# Altium footprint library MyComponents_v2.5.PcbLib: 403 footprints (part 16 of 26)
Each footprint in its own frame and in the unit in brackets; x right, y up, seen from the top. Pads: shape width x height; smd on the part's side, far side on the other; paste and mask are expansions set on the pad; w line width, h text height; cw(c..) or ccw(c..) is an arc to the next point about the centre after c.
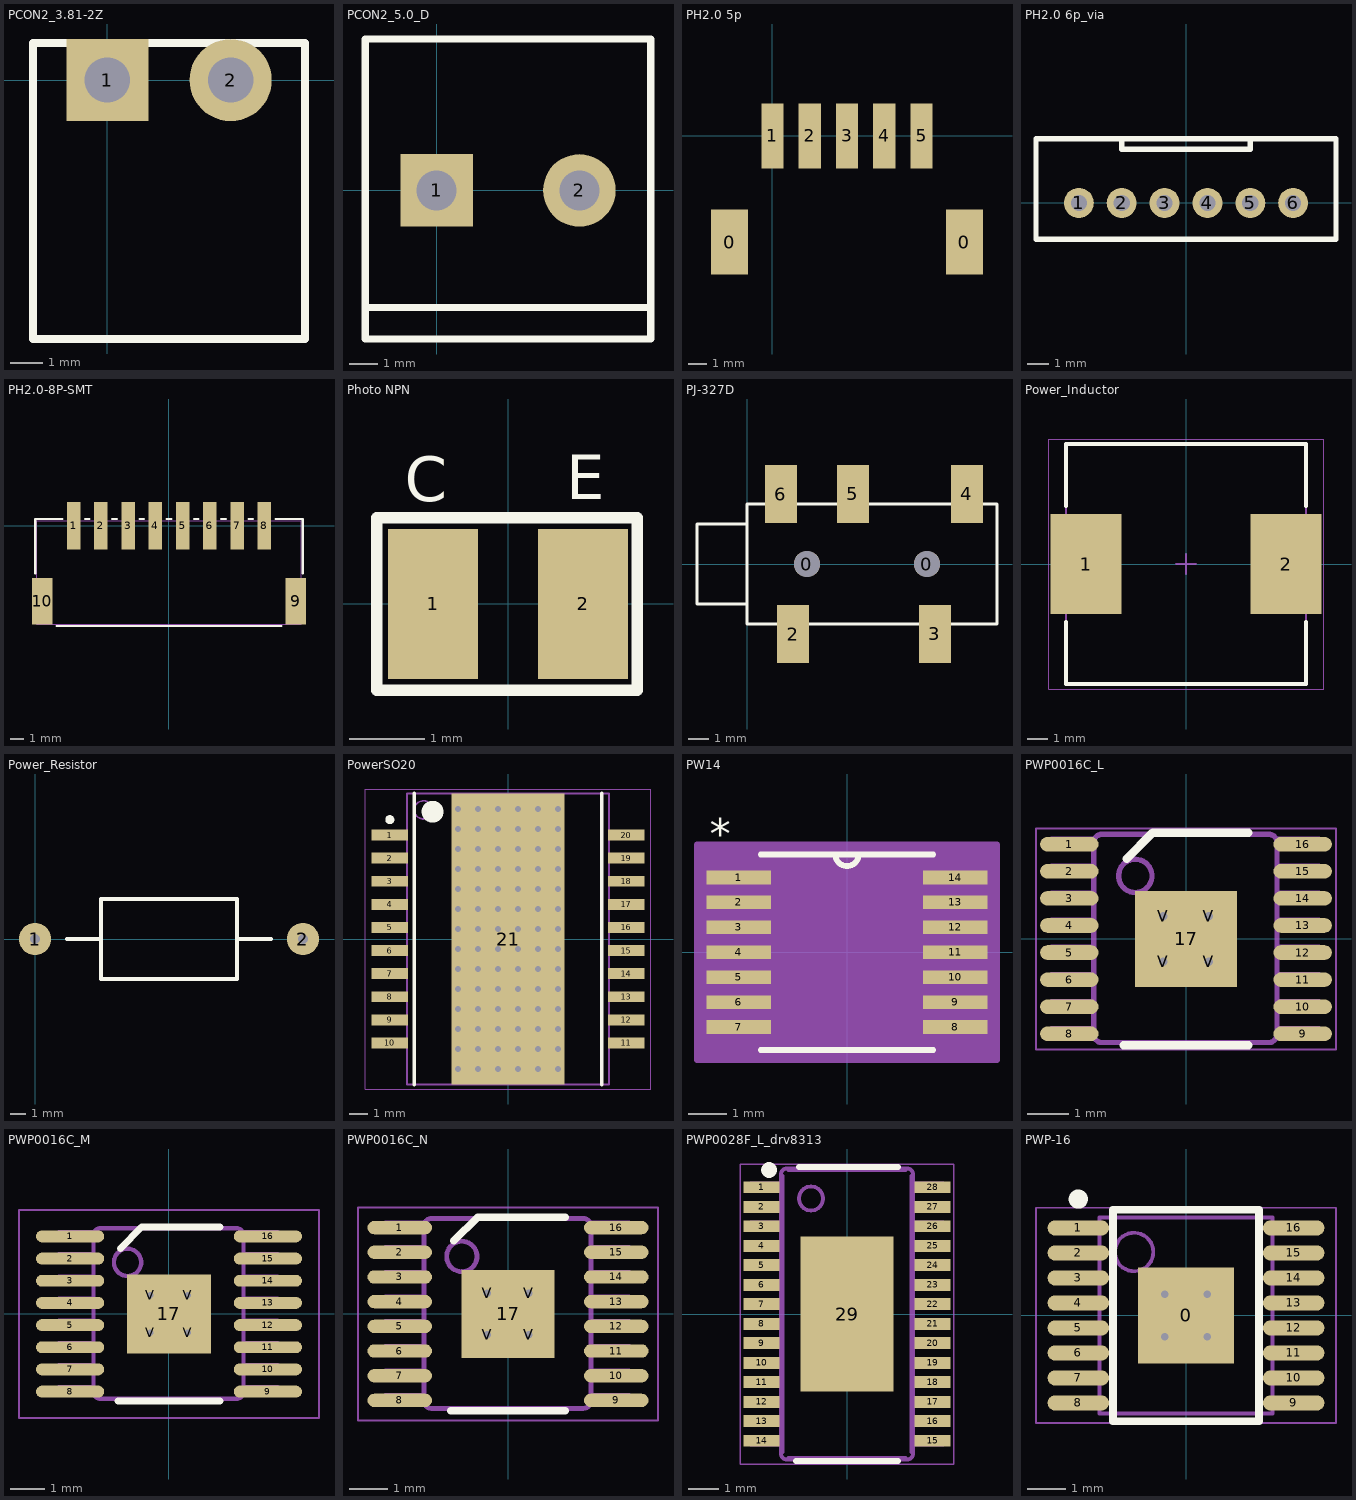
[diagram p15: the footprints below, top view; thin cyan lines are the x and y axes]

## PCON2_3.81-2Z [mm]
pads (2):
  rect 2.54x2.54 hole 1.4: 1(0,0)
  round 2.54 hole 1.4: 2(3.81,0)
Top Overlay:
  lines w0.254: -2.3,-8.001 -2.3,1.143 6.11,1.143 6.11,-8 -2.286,-8

## PCON2_5.0_D [mm]
pads (2):
  rect 2.54x2.54 hole 1.4: 1(0,0)
  round 2.54 hole 1.4: 2(5,0)
Top Overlay:
  lines w0.254: -2.4,-4.1 7.5,-4.1 ; -2.5,-5.2 -2.5,5.3 7.5,5.3 7.5,-5.2 -2.5,-5.2

## PH2.0 5p [mm]
pads (7):
  rect 2x3.5 smd: 0(-2.3,-5.7) 0(10.3,-5.7)
  rect 1.2x3.5 smd: 1(0,0) 2(2,0) 3(4,0) 4(6,0) 5(8,0)

## PH2.0 6p_via [mm]
pads (6):
  round 1.4 hole 0.75: 1(-5,0) 2(-3,0) 3(-1,0) 4(1,0) 5(3,0) 6(5,0)
Top Overlay:
  lines w0.254: -3,3 -3,2.5 3,2.5 3,3 ; -7,-1.7 7,-1.7 7,3 -7,3 -7,-1.7

## PH2.0-8P-SMT [mm]
pads (10):
  rect 1x3.5 smd paste+0 mask+0: 1(-7,0) 2(-5,0) 3(-3,0) 4(-1,0) 5(1,0) 6(3,0) 7(5,0) 8(7,0)
  rect 1.5x3.4 smd: 9(9.32,-5.55) 10(-9.32,-5.55)
Top Overlay:
  lines w0.152: -9.827,-3.517 -9.827,0.477 -7.833,0.477 ; -8.262,-7.377 8.262,-7.377 ; -6.167,0.477 -5.833,0.477 ; -4.167,0.477 -3.833,0.477 ; -2.167,0.477 -1.833,0.477 ; -0.167,0.477 0.167,0.477 ; 1.833,0.477 2.167,0.477 ; 3.833,0.477 4.167,0.477 ; 5.833,0.477 6.167,0.477 ; 7.833,0.477 9.827,0.477 9.827,-3.517
Mechanical 13:
  lines w0.025: -9.7,-7.25 -9.7,0.35 9.7,0.35 9.7,-7.25 -9.7,-7.25
3D body "PH2.0_SMT_8P.stp": height 5.6, standoff 0, extent -9.7,-7 9.7,1.6
3D body: height 0.25, standoff 0, extent -7.254,-0.254 -7,0

## Photo NPN [mm] "Photo NPN for 测评测速模块"
pads (2):
  rect 1.2x2 smd: 1(-1,0) 2(1,0)
Top Overlay:
  lines w0.15: -1.75,-1.15 1.725,-1.15 1.725,1.15 -1.75,1.15 -1.75,-1.15
  text "E" at 0.775,1.2 h1.02
  text "C" at -1.375,1.175 h1.02

## PJ-327D [mm]
pads (7):
  round 1.3 hole 1.3: 0(3,0) 0(9,0)
  rect 1.6x2.9 smd: 2(2.3,-3.5) 3(9.39,-3.5) 4(10.99,3.5) 5(5.3,3.5) 6(1.7,3.5)
Top Overlay:
  lines w0.127: 0,-2 -2.5,-2 -2.5,2 0,2 ; 0,-3 12.5,-3 12.5,3 0,3 0,0 0,-3

## Power_Inductor [mm] "Precision Wire Wound Inductor, 2-Leads, Body 12.00x12.00mm, IPC Medium Density"
height 7
pads (2):
  rect 3.55x5 smd: 1(-5,0) 2(5,0)
Top Overlay:
  lines w0.2: -6,-2.9 -6,-6 6,-6 6,-2.9 ; -6,2.9 -6,6 6,6 6,2.9
Mechanical 13:
  lines w0.1: -6,-6 -6,6 6,6 6,-6 -6,-6
Mechanical 15:
  lines w0.05: -6.875,-6.25 -6.875,6.25 6.875,6.25 6.875,-6.25 -6.875,-6.25
  lines w0.1: -0.5,0 0.5,0 ; 0,-0.5 0,0.5
3D body "Inductor12x12x6.step": height 6.21, standoff -0.09, extent -6.1,-6.1 6.1,6.1

## Power_Resistor [mil]
pads (2):
  round 80 hole 25: 1(0,0) 2(669.29,0)
Top Overlay:
  lines w10: 80,0 165,0 ; 504.29,0 589.29,0 ; 165,0 165,100 504.29,100 504.29,-100 165,-100 165,0

## PowerSO20 [mm] "SOIC, 20-Leads, Body 15.90x11.00mm, Pitch 1.27mm, Thermal Pad 16.00x6.20mm, IPC Medium Density"
height 3.6
pads (21):
  rect 2x0.6 smd: 1(-6.5,5.715) 2(-6.5,4.445) 3(-6.5,3.175) 4(-6.5,1.905) 5(-6.5,0.635) 6(-6.5,-0.635) 7(-6.5,-1.905) 8(-6.5,-3.175) 9(-6.5,-4.445) 10(-6.5,-5.715) 11(6.5,-5.715) 12(6.5,-4.445) 13(6.5,-3.175) 14(6.5,-1.905) 15(6.5,-0.635) 16(6.5,0.635) 17(6.5,1.905) 18(6.5,3.175) 19(6.5,4.445) 20(6.5,5.715)
  rect 6.2x16 smd: 21(0,0)
via 2.75,6.05 diameter 0.635 hole 0.305
via -2.75,6.05 diameter 0.635 hole 0.305
via -1.65,6.05 diameter 0.635 hole 0.305
via -0.55,6.05 diameter 0.635 hole 0.305
via 0.55,6.05 diameter 0.635 hole 0.305
via 1.65,6.05 diameter 0.635 hole 0.305
via 2.75,3.85 diameter 0.635 hole 0.305
via -2.75,3.85 diameter 0.635 hole 0.305
via -1.65,3.85 diameter 0.635 hole 0.305
via -0.55,3.85 diameter 0.635 hole 0.305
via 0.55,3.85 diameter 0.635 hole 0.305
via 1.65,3.85 diameter 0.635 hole 0.305
via 2.75,7.15 diameter 0.635 hole 0.305
via 2.75,4.95 diameter 0.635 hole 0.305
via 2.75,2.75 diameter 0.635 hole 0.305
via 2.75,1.65 diameter 0.635 hole 0.305
via 2.75,0.55 diameter 0.635 hole 0.305
via 2.75,-0.55 diameter 0.635 hole 0.305
via 2.75,-1.65 diameter 0.635 hole 0.305
via 2.75,-2.75 diameter 0.635 hole 0.305
via 2.75,-3.85 diameter 0.635 hole 0.305
via 2.75,-4.95 diameter 0.635 hole 0.305
via 2.75,-6.05 diameter 0.635 hole 0.305
via 2.75,-7.15 diameter 0.635 hole 0.305
via -2.75,7.15 diameter 0.635 hole 0.305
via -1.65,7.15 diameter 0.635 hole 0.305
via -0.55,7.15 diameter 0.635 hole 0.305
via 0.55,7.15 diameter 0.635 hole 0.305
via 1.65,7.15 diameter 0.635 hole 0.305
via -2.75,4.95 diameter 0.635 hole 0.305
via -1.65,4.95 diameter 0.635 hole 0.305
via -0.55,4.95 diameter 0.635 hole 0.305
via 0.55,4.95 diameter 0.635 hole 0.305
via 1.65,4.95 diameter 0.635 hole 0.305
via -2.75,2.75 diameter 0.635 hole 0.305
via -1.65,2.75 diameter 0.635 hole 0.305
via -0.55,2.75 diameter 0.635 hole 0.305
via 0.55,2.75 diameter 0.635 hole 0.305
via 1.65,2.75 diameter 0.635 hole 0.305
via -2.75,1.65 diameter 0.635 hole 0.305
via -1.65,1.65 diameter 0.635 hole 0.305
via -0.55,1.65 diameter 0.635 hole 0.305
via 0.55,1.65 diameter 0.635 hole 0.305
via 1.65,1.65 diameter 0.635 hole 0.305
via -2.75,0.55 diameter 0.635 hole 0.305
via -1.65,0.55 diameter 0.635 hole 0.305
via -0.55,0.55 diameter 0.635 hole 0.305
via 0.55,0.55 diameter 0.635 hole 0.305
via 1.65,0.55 diameter 0.635 hole 0.305
via -2.75,-0.55 diameter 0.635 hole 0.305
via -1.65,-0.55 diameter 0.635 hole 0.305
via -0.55,-0.55 diameter 0.635 hole 0.305
via 0.55,-0.55 diameter 0.635 hole 0.305
via 1.65,-0.55 diameter 0.635 hole 0.305
via -2.75,-1.65 diameter 0.635 hole 0.305
via -1.65,-1.65 diameter 0.635 hole 0.305
via -0.55,-1.65 diameter 0.635 hole 0.305
via 0.55,-1.65 diameter 0.635 hole 0.305
via 1.65,-1.65 diameter 0.635 hole 0.305
via -2.75,-2.75 diameter 0.635 hole 0.305
via -1.65,-2.75 diameter 0.635 hole 0.305
via -0.55,-2.75 diameter 0.635 hole 0.305
via 0.55,-2.75 diameter 0.635 hole 0.305
via 1.65,-2.75 diameter 0.635 hole 0.305
via -2.75,-3.85 diameter 0.635 hole 0.305
via -1.65,-3.85 diameter 0.635 hole 0.305
via -0.55,-3.85 diameter 0.635 hole 0.305
via 0.55,-3.85 diameter 0.635 hole 0.305
via 1.65,-3.85 diameter 0.635 hole 0.305
via -2.75,-4.95 diameter 0.635 hole 0.305
via -1.65,-4.95 diameter 0.635 hole 0.305
via -0.55,-4.95 diameter 0.635 hole 0.305
via 0.55,-4.95 diameter 0.635 hole 0.305
via 1.65,-4.95 diameter 0.635 hole 0.305
via -2.75,-6.05 diameter 0.635 hole 0.305
via -1.65,-6.05 diameter 0.635 hole 0.305
via -0.55,-6.05 diameter 0.635 hole 0.305
via 0.55,-6.05 diameter 0.635 hole 0.305
via 1.65,-6.05 diameter 0.635 hole 0.305
via -2.75,-7.15 diameter 0.635 hole 0.305
via -1.65,-7.15 diameter 0.635 hole 0.305
via -0.55,-7.15 diameter 0.635 hole 0.305
via 0.55,-7.15 diameter 0.635 hole 0.305
via 1.65,-7.15 diameter 0.635 hole 0.305
Top Overlay:
  circle w0.25: c-6.5,6.565 r0.125
  circle w0.6: c-4.15,7 r0.3
  lines w0.2: -5.15,-8 -5.15,8 ; 5.15,-8 5.15,8
Mechanical 13:
  circle w0.1: c-4.65,7.1 r0.5
  lines w0.1: -5.55,-8 -5.55,8 5.55,8 5.55,-8 -5.55,-8
Mechanical 15:
  lines w0.05: -7.85,-8.25 -7.85,8.25 7.85,8.25 7.85,-8.25 -7.85,-8.25
  lines w0.1: -0.5,0 0.5,0 ; 0,-0.5 0,0.5
3D body: height 3.6, standoff 0.1, extent -5.55,-8 5.55,8

## PW14 [mil]
pads (14):
  rect 66x14 smd: 1(-111,76.77) 2(-111,51.18) 3(-111,25.59) 4(-111,0) 5(-111,-25.59) 6(-111,-51.18) 7(-111,-76.77) 8(111,-76.77) 9(111,-51.18) 10(111,-25.59) 11(111,0) 12(111,25.59) 13(111,51.18) 14(111,76.77)
Top Overlay:
  lines w6: -88.5,-100.5 88.5,-100.5 ; -88.5,100.5 88.5,100.5 ; -12,100.5 ccw(c0,100.5) 12,100.5
  text "*" at -141,105.77 h32
Mechanical 13:
  lines w0: -12,100.5 ccw(c0,100.5) 12,100.5
  text "*" at -141,105.77 h32
Mechanical 15:
  region: 154,-110.5 -154,-110.5 -154,110.5 154,110.5
  lines w6: -154,-110.5 154,-110.5 154,110.5 -154,110.5 -154,-110.5
3D body "PWP14.step": height 47.24, standoff 0, extent -125.98,-100.39 125.99,100.4

## PWP0016C_L [mm]
pads (21):
  oval 1.4x0.35 smd paste-0.102 mask+0.051: 1(-2.8,2.275) 2(-2.8,1.625) 3(-2.8,0.975) 4(-2.8,0.325) 5(-2.8,-0.325) 6(-2.8,-0.975) 7(-2.8,-1.625) 8(-2.8,-2.275) 9(2.8,-2.275) 10(2.8,-1.625) 11(2.8,-0.975) 12(2.8,-0.325) 13(2.8,0.325) 14(2.8,0.975) 15(2.8,1.625) 16(2.8,2.275)
  rect 2.46x2.31 smd paste-0.102 mask+0.051: 17(0,0)
  round 0.5 / inner round 1.524 / far side round 0.5 hole 0.203 mask+0.051: V(-0.55,-0.55) V(-0.55,0.55) V(0.55,-0.55) V(0.55,0.55)
Top Overlay:
  lines w0.2: -1.5,-2.55 1.5,-2.55 ; -1.425,1.925 -0.8,2.55 1.5,2.55
Mechanical 13:
  drawing of 202 lines, arcs and shapes, not listed
Mechanical 15:
  lines w0.05: -3.6,-2.65 -3.6,2.65 3.6,2.65 3.6,-2.65 -3.6,-2.65
  lines w0.1: -0.5,0 0.5,0 ; 0,-0.5 0,0.5
3D body "User Library-TSSOP-16-2.STEP": height 1.2, standoff 0, extent -3.225,-2.515 3.175,2.485

## PWP0016C_M [mm]
pads (21):
  oval 2x0.35 smd paste-0.102 mask+0.051: 1(-2.9,2.275) 2(-2.9,1.625) 3(-2.9,0.975) 4(-2.9,0.325) 5(-2.9,-0.325) 6(-2.9,-0.975) 7(-2.9,-1.625) 8(-2.9,-2.275) 9(2.9,-2.275) 10(2.9,-1.625) 11(2.9,-0.975) 12(2.9,-0.325) 13(2.9,0.325) 14(2.9,0.975) 15(2.9,1.625) 16(2.9,2.275)
  rect 2.46x2.31 smd paste-0.102 mask+0.051: 17(0,0)
  round 0.5 / inner round 1.524 / far side round 0.5 hole 0.203 mask+0.051: V(-0.55,-0.55) V(-0.55,0.55) V(0.55,-0.55) V(0.55,0.55)
Top Overlay:
  lines w0.2: -1.5,-2.55 1.5,-2.55 ; -1.425,1.925 -0.8,2.55 1.5,2.55
Mechanical 13:
  drawing of 202 lines, arcs and shapes, not listed
Mechanical 15:
  lines w0.05: -4.4,-3.05 4.4,-3.05 4.4,3.05 -4.4,3.05 -4.4,-3.05
  lines w0.1: -0.5,0 0.5,0 ; 0,-0.5 0,0.5
3D body "User Library-TSSOP-16-2.STEP": height 1.2, standoff 0, extent -3.073,-2.515 3.327,2.485

## PWP0016C_N [mm]
pads (21):
  oval 1.7x0.35 smd paste-0.102 mask+0.051: 1(-2.85,2.275) 2(-2.85,1.625) 3(-2.85,0.975) 4(-2.85,0.325) 5(-2.85,-0.325) 6(-2.85,-0.975) 7(-2.85,-1.625) 8(-2.85,-2.275) 9(2.85,-2.275) 10(2.85,-1.625) 11(2.85,-0.975) 12(2.85,-0.325) 13(2.85,0.325) 14(2.85,0.975) 15(2.85,1.625) 16(2.85,2.275)
  rect 2.46x2.31 smd paste-0.102 mask+0.051: 17(0,0)
  round 0.5 / inner round 1.524 / far side round 0.5 hole 0.203 mask+0.051: V(-0.55,-0.55) V(-0.55,0.55) V(0.55,-0.55) V(0.55,0.55)
Top Overlay:
  lines w0.2: -1.5,-2.55 1.5,-2.55 ; -1.425,1.925 -0.8,2.55 1.5,2.55
Mechanical 13:
  drawing of 202 lines, arcs and shapes, not listed
Mechanical 15:
  lines w0.05: -3.95,-2.8 -3.95,2.8 3.95,2.8 3.95,-2.8 -3.95,-2.8
  lines w0.1: -0.5,0 0.5,0 ; 0,-0.5 0,0.5
3D body "User Library-TSSOP-16-2.STEP": height 1.2, standoff 0, extent -3.225,-2.515 3.175,2.485

## PWP0028F_L_drv8313 [mm]
pads (29):
  rect 1.2x0.4 smd paste+0 mask+0.051: 1(-2.85,4.225) 2(-2.85,3.575) 3(-2.85,2.925) 4(-2.85,2.275) 5(-2.85,1.625) 6(-2.85,0.975) 7(-2.85,0.325) 8(-2.85,-0.325) 9(-2.85,-0.975) 10(-2.85,-1.625) 11(-2.85,-2.275) 12(-2.85,-2.925) 13(-2.85,-3.575) 14(-2.85,-4.225) 15(2.85,-4.225) 16(2.85,-3.575) 17(2.85,-2.925) 18(2.85,-2.275) 19(2.85,-1.625) 20(2.85,-0.975) 21(2.85,-0.325) 22(2.85,0.325) 23(2.85,0.975) 24(2.85,1.625) 25(2.85,2.275) 26(2.85,2.925) 27(2.85,3.575) 28(2.85,4.225)
  rect 3.1x5.18 smd paste+0 mask+0.051: 29(0,0)
Top Overlay:
  circle w0.254: c-2.6,4.8 r0.135
  lines w0.2: -1.7,-4.9 1.7,-4.9 ; -1.6,4.9 1.7,4.9
Mechanical 13:
  drawing of 350 lines, arcs and shapes, not listed
Mechanical 15:
  lines w0.05: -3.55,-5 -3.55,5 3.55,5 3.55,-5 -3.55,-5
  lines w0.1: -0.5,0 0.5,0 ; 0,-0.5 0,0.5
3D body: height 1.13, standoff 0, extent -3.2,-4.838 3.2,4.862

## PWP-16 [mm] "16pin,0.65mm pitch,thermal pad"
height 1.2
pads (17):
  rect 2.5x2.5 smd: 0(0,0)
  oval 1.6x0.4 smd: 1(-2.8,2.275) 2(-2.8,1.625) 3(-2.8,0.975) 4(-2.8,0.325) 5(-2.8,-0.325) 6(-2.8,-0.975) 7(-2.8,-1.625) 8(-2.8,-2.275) 9(2.8,-2.275) 10(2.8,-1.625) 11(2.8,-0.975) 12(2.8,-0.325) 13(2.8,0.325) 14(2.8,0.975) 15(2.8,1.625) 16(2.8,2.275)
via 0.55,-0.55 diameter 0.5 hole 0.2
via -0.55,-0.55 diameter 0.5 hole 0.2
via 0.55,0.55 diameter 0.5 hole 0.2
via -0.55,0.55 diameter 0.5 hole 0.2
Top Overlay:
  circle w0.25: c-2.8,3.025 r0.125
  lines w0.2: -1.9,-2.75 1.9,-2.75 1.9,2.75 -1.9,2.75 -1.9,-2.75
Mechanical 13:
  circle w0.1: c-1.35,1.65 r0.5
  lines w0.1: -2.25,-2.55 2.25,-2.55 2.25,2.55 -2.25,2.55 -2.25,-2.55
Mechanical 15:
  lines w0.05: -3.9,-2.8 3.9,-2.8 3.9,2.8 -3.9,2.8 -3.9,-2.8
  lines w0.1: -0.5,0 0.5,0 ; 0,-0.5 0,0.5
3D body: height 1.2, standoff 0.05, extent -2.25,-2.55 2.25,2.55